# Altium footprint library 5ko.PcbLib: 126 footprints (part 7 of 8)
Each footprint in its own frame and in the unit in brackets; x right, y up, seen from the top. Pads: shape width x height; smd on the part's side, far side on the other; paste and mask are expansions set on the pad; w line width, h text height; cw(c..) or ccw(c..) is an arc to the next point about the centre after c.
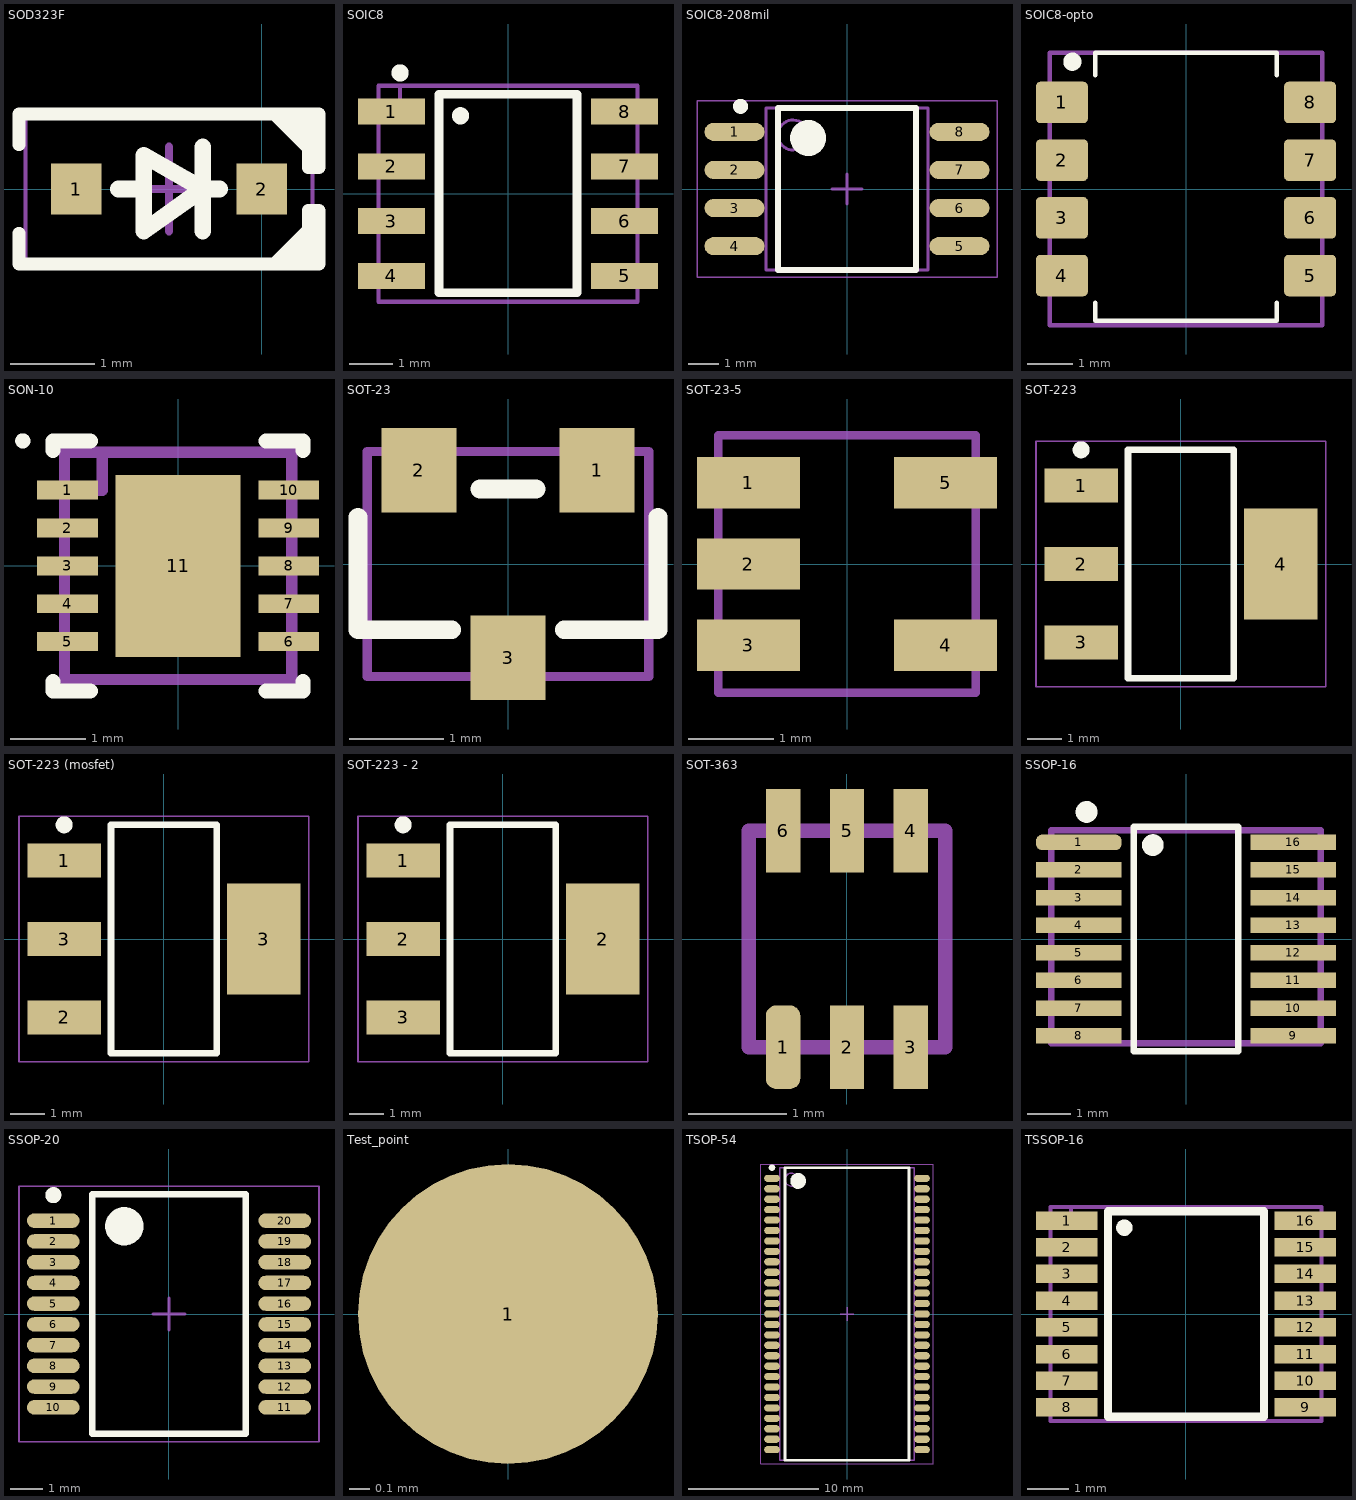
[diagram p6: the footprints below, top view; thin cyan lines are the x and y axes]

## SOD323F [mm] "SODFL, 2-Leads, Body 1.25x2.50mm, IPC Medium Density"
height 0.8
pads (2):
  rect 0.6x0.6 smd: 1(-2.2,0) 2(0,0)
Top Overlay:
  region: 0.678,0.254 0.1,0.832 0.1,0.9 0.667,0.9 0.678,0.889
  region: 0.678,-0.254 0.1,-0.832 0.1,-0.9 0.667,-0.9 0.678,-0.889
  lines w0.15: -2.878,-0.525 -2.878,-0.889 0.678,-0.889 0.678,-0.254 0.551,-0.254 0.551,-0.889 ; -2.878,0.525 -2.878,0.889 0.678,0.889 0.678,0.254 0.551,0.254 0.551,0.889
  lines w0.2: -1.7,0 -1.4,0 ; -0.7,-0.5 -0.7,0.5 ; -0.5,0 -0.7,0 ; -0.7,0 -1.4,-0.5 -1.4,0.4 -0.7,0
Mechanical 15:
  lines w0.05: -2.8,-0.85 0.6,-0.85 0.6,0.85 -2.8,0.85 -2.8,-0.85
  lines w0.1: -1.6,0 -0.6,0 ; -1.1,-0.5 -1.1,0.5
3D body "SOD323F.STEP": height 0.8, standoff 0, extent -2.35,-0.625 0.15,0.625

## SOIC8 [mm]
pads (8):
  rect 1.55x0.6 smd: 1(-2.7,1.905) 2(-2.7,0.635) 3(-2.7,-0.635) 4(-2.7,-1.905) 5(2.7,-1.905) 6(2.7,-0.635) 7(2.7,0.635) 8(2.7,1.905)
Top Layer:
  region: -2.7,1.905
Top Overlay:
  circle w0.2: c-1.1,1.805 r0.1
  circle w0.2: c-2.5,2.8 r0.1
  lines w0.2: -1.6,-2.295 1.6,-2.295 1.6,2.305 -1.6,2.305 -1.6,-2.295
Mechanical 15:
  lines w0.1: -3,2 -2.5,2 -2.5,2.5 ; -3,-2.5 3,-2.5 3,2.5 -3,2.5 -3,-2.5
  text ".Designator" at -2.1,-0.195 h0.5
3D body "SOIC-8-1.step": height 1.75, standoff 0, extent -3,-2.45 3,2.45

## SOIC8-208mil [mm] "SOIC, 8-Leads, Body 5.28x5.28mm, Pitch 1.27mm, IPC Medium Density"
height 2.16
pads (8):
  oval 2x0.6 smd: 1(-3.75,1.905) 2(-3.75,0.635) 3(-3.75,-0.635) 4(-3.75,-1.905) 5(3.75,-1.905) 6(3.75,-0.635) 7(3.75,0.635) 8(3.75,1.905)
Top Overlay:
  circle w0.6: c-1.3,1.7 r0.3
  circle w0.25: c-3.55,2.755 r0.125
  lines w0.2: -2.3,-2.7 2.3,-2.7 2.3,2.7 -2.3,2.7 -2.3,-2.7
Mechanical 13:
  circle w0.1: c-1.8,1.8 r0.5
  lines w0.1: -2.7,-2.7 2.7,-2.7 2.7,2.7 -2.7,2.7 -2.7,-2.7
Mechanical 15:
  lines w0.05: -5,-2.95 5,-2.95 5,2.95 -5,2.95 -5,-2.95
  lines w0.1: -0.5,0 0.5,0 ; 0,-0.5 0,0.5
3D body "User Library-SOIC-8-208.STEP": height 2.2, standoff 0.05, extent -4.1,-2.7 4.1,2.7

## SOIC8-opto [mm]
pads (8):
  rrect20% 1.14x0.91 smd: 1(-2.73,1.905) 2(-2.73,0.635) 3(-2.73,-0.635) 4(-2.73,-1.905) 5(2.73,-1.905) 6(2.73,-0.635) 7(2.73,0.635) 8(2.73,1.905)
Top Overlay:
  circle w0.2: c-2.5,2.8 r0.1
  lines w0.1: -2,-2.5 -2,-2.9 2,-2.9 2,-2.5 ; -2,2.5 -2,3 2,3 2,2.5
Mechanical 15:
  lines w0.1: -3,-3 -3,3 3,3 3,-3 -3,-3
  text ".Designator" at -1.2,0 h0.5
3D body "User Library-SOIC127P610X343-8N.STEP": height 3.48, standoff 0, extent -3,-2.92 3,2.92

## SON-10 [mm] "SON, 10-Leads, Body 3,00x3,00mm, Pitch 0,50mm, Thermal Pad 2,40x1,65mm, IPC Medium Density"
height 0.75
pads (11):
  rect 0.8x0.25 smd: 1(-1.46,1) 2(-1.46,0.5) 3(-1.46,0) 4(-1.46,-0.5) 5(-1.46,-1) 6(1.46,-1) 7(1.46,-0.5) 8(1.46,0) 9(1.46,0.5) 10(1.46,1)
  rect 1.65x2.4 smd: 11(0,0)
Top Overlay:
  circle w0.1: c-2.05,1.65 r0.05
  lines w0.2: -1.65,-1.525 -1.65,-1.65 -1.16,-1.65 ; -1.65,1.525 -1.65,1.65 -1.16,1.65 ; 1.16,-1.65 1.65,-1.65 1.65,-1.525 ; 1.16,1.65 1.65,1.65 1.65,1.525
Mechanical 15:
  lines w0.15: -1.5,1 -1,1 -1,1.5 ; -1.5,-1.5 1.5,-1.5 1.5,1.5 -1.5,1.5 -1.5,-1.5
  text ".Designator" at -1.2,-0.1 h0.3
3D body "SON10-3x3mm.step": height 0.87, standoff -0.03, extent -1.5,-1.5 1.5,1.5

## SOT-23 [mm]
pads (3):
  rect 0.8x0.9 smd: 1(0.95,1) 2(-0.95,1) 3(0,-1)
Top Overlay:
  lines w0.2: -1.6,0.5 -1.6,-0.7 -0.6,-0.7 ; -0.3,0.8 0.3,0.8 ; 0.6,-0.7 1.6,-0.7 1.6,0.5
Mechanical 15:
  lines w0.1: -1.5,-1.2 1.5,-1.2 1.5,1.2 -1.5,1.2 -1.5,-1.2
  text ".Designator" at -1.75,-0.1 h0.5
3D body "SOT-23.stp": height 0.98, standoff 0, extent -1.46,-1.2 1.46,1.2

## SOT-23-5 [mm]
pads (5):
  rect 1.2x0.6 smd: 1(-1.15,0.95) 2(-1.15,0) 3(-1.15,-0.95) 4(1.15,-0.95) 5(1.15,0.95)
Mechanical 15:
  lines w0.1: -1.5,-1.5 1.5,-1.5 1.5,1.5 -1.5,1.5 -1.5,-1.5
  text ".Designator" at -1.7,-0.1 h0.5
3D body "User Library-SOT23-5-1.step": height 1.3, standoff 0, extent -1.5,-1.5 1.5,1.5

## SOT-223 [mm]
height 1.8
pads (4):
  rect 2.15x1 smd: 1(-2.925,2.3) 2(-2.925,0) 3(-2.925,-2.3)
  rect 2.15x3.25 smd: 4(2.925,0)
Top Overlay:
  circle w0.25: c-2.925,3.35 r0.125
  lines w0.2: -1.55,-3.35 -1.55,3.35 1.55,3.35 1.55,-3.35 -1.55,-3.35
Mechanical 15:
  lines w0.05: -4.25,-3.6 -4.25,3.6 4.25,3.6 4.25,-3.6 -4.25,-3.6
  text ".Designator" at -1.65,-0.2 h0.5
3D body "ALSRobot-SOT-223.step": height 1.64, standoff -0.01, extent -3.5,-3.25 3.5,3.25

## SOT-223 (mosfet) [mm]
height 1.8
pads (4):
  rect 2.15x1 smd: 1(-2.925,2.3) 2(-2.925,-2.3) 3(-2.925,0)
  rect 2.15x3.25 smd: 3(2.925,0)
Top Overlay:
  circle w0.25: c-2.925,3.35 r0.125
  lines w0.2: -1.55,-3.35 -1.55,3.35 1.55,3.35 1.55,-3.35 -1.55,-3.35
Mechanical 15:
  lines w0.05: -4.25,-3.6 -4.25,3.6 4.25,3.6 4.25,-3.6 -4.25,-3.6
  text ".Designator" at -1.65,-0.2 h0.5
3D body "ALSRobot-SOT-223.step": height 1.64, standoff -0.01, extent -3.5,-3.25 3.5,3.25

## SOT-223 - 2 [mm]
height 1.8
pads (4):
  rect 2.15x1 smd: 1(-2.925,2.3) 2(-2.925,0) 3(-2.925,-2.3)
  rect 2.15x3.25 smd: 2(2.925,0)
Top Overlay:
  circle w0.25: c-2.925,3.35 r0.125
  lines w0.2: -1.55,-3.35 -1.55,3.35 1.55,3.35 1.55,-3.35 -1.55,-3.35
Mechanical 15:
  lines w0.05: -4.25,-3.6 -4.25,3.6 4.25,3.6 4.25,-3.6 -4.25,-3.6
  text ".Designator" at -1.65,-0.2 h0.5
3D body "ALSRobot-SOT-223.step": height 1.64, standoff -0.01, extent -3.5,-3.25 3.5,3.25

## SOT-363 [mm]
pads (6):
  rrect60% 0.35x0.85 smd mask+0.07: 1(-0.65,-1.1)
  rect 0.35x0.85 smd mask+0.07: 2(0,-1.1) 3(0.65,-1.1) 4(0.65,1.1) 5(0,1.1) 6(-0.65,1.1)
Mechanical 15:
  lines w0.15: -1,-1.1 1,-1.1 1,1.1 -1,1.1 -1,-1.1
  text ".Designator" at 0.1,-0.8 h0.3
3D body "SOT-363.stp": height 1, standoff 0, extent -1,-1.1 1,1.1

## SSOP-16 [mil]
pads (16):
  rrect80% 77.56x13.97 smd paste+0 mask+0: 1(-97,87.5)
  rect 77.56x13.97 smd paste+0 mask+0: 2(-97,62.5) 3(-97,37.5) 4(-97,12.5) 5(-97,-12.5) 6(-97,-37.5) 7(-97,-62.5) 8(-97,-87.5) 9(97,-87.5) 10(97,-62.5) 11(97,-37.5) 12(97,-12.5) 13(97,12.5) 14(97,37.5) 15(97,62.5) 16(97,87.5)
Top Overlay:
  circle w9.84: c-30,85 r4.92
  circle w9.84: c-90,115 r4.92
  lines w5.91: -47.16,-101.5 -47.16,101.5 ; 47.16,-101.5 47.16,101.5
  lines w6: -47.16,-101.5 47.16,-101.5 ; -47.16,101.5 47.16,101.5
Mechanical 15:
  lines w5.91: -122.05,-94.49 -122.05,98.43 122.05,98.43 122.05,-94.49 -122.05,-94.49
  text ".Designator" at -35.43,-3.94 h11.81
3D body "SSOP-16_FTD.step": height 69.09, standoff 0, extent -122,-95.51 122.01,97.48

## SSOP-20 [mm] "7.2 х 5.3"
height 2
pads (20):
  oval 1.65x0.45 smd: 1(-3.625,2.925) 2(-3.625,2.275) 3(-3.625,1.625) 4(-3.625,0.975) 5(-3.625,0.325) 6(-3.625,-0.325) 7(-3.625,-0.975) 8(-3.625,-1.625) 9(-3.625,-2.275) 10(-3.625,-2.925) 11(3.625,-2.925) 12(3.625,-2.275) 13(3.625,-1.625) 14(3.625,-0.975) 15(3.625,-0.325) 16(3.625,0.325) 17(3.625,0.975) 18(3.625,1.625) 19(3.625,2.275) 20(3.625,2.925)
Top Overlay:
  circle w0.6: c-1.4,2.75 r0.3
  circle w0.25: c-3.625,3.725 r0.125
  lines w0.2: -2.4,-3.75 2.4,-3.75 2.4,3.75 -2.4,3.75 -2.4,-3.75
Mechanical 15:
  lines w0.05: -4.7,-4 4.7,-4 4.7,4 -4.7,4 -4.7,-4
  lines w0.1: -0.5,0 0.5,0 ; 0,-0.5 0,0.5
3D body "User Library-SSOP-20.STEP": height 1.9, standoff 0, extent -3.9,-3.6 3.9,3.6

## Test_point [mm]
pads (1):
  round 1.5 smd mask+0.07: 1(0,0)

## TSOP-54 [mm] "TSOP, 54-Leads, Body 22.22x10.16mm, Pitch 0.80mm, IPC Medium Density"
height 1.2
pads (54):
  oval 1.2x0.55 smd: 1(-5.75,10.4) 2(-5.75,9.6) 3(-5.75,8.8) 4(-5.75,8) 5(-5.75,7.2) 6(-5.75,6.4) 7(-5.75,5.6) 8(-5.75,4.8) 9(-5.75,4) 10(-5.75,3.2) 11(-5.75,2.4) 12(-5.75,1.6) 13(-5.75,0.8) 14(-5.75,0) 15(-5.75,-0.8) 16(-5.75,-1.6) 17(-5.75,-2.4) 18(-5.75,-3.2) 19(-5.75,-4) 20(-5.75,-4.8) 21(-5.75,-5.6) 22(-5.75,-6.4) 23(-5.75,-7.2) 24(-5.75,-8) 25(-5.75,-8.8) 26(-5.75,-9.6) 27(-5.75,-10.4) 28(5.75,-10.4) 29(5.75,-9.6) 30(5.75,-8.8) 31(5.75,-8) 32(5.75,-7.2) 33(5.75,-6.4) 34(5.75,-5.6) 35(5.75,-4.8) 36(5.75,-4) 37(5.75,-3.2) 38(5.75,-2.4) 39(5.75,-1.6) 40(5.75,-0.8) 41(5.75,0) 42(5.75,0.8) 43(5.75,1.6) 44(5.75,2.4) 45(5.75,3.2) 46(5.75,4) 47(5.75,4.8) 48(5.75,5.6) 49(5.75,6.4) 50(5.75,7.2) 51(5.75,8) 52(5.75,8.8) 53(5.75,9.6) 54(5.75,10.4)
Top Overlay:
  circle w0.6: c-3.75,10.2 r0.3
  circle w0.25: c-5.75,11.225 r0.125
  lines w0.2: -4.75,-11.2 4.75,-11.2 4.75,11.2 -4.75,11.2 -4.75,-11.2
Mechanical 13:
  circle w0.1: c-4.25,10.3 r0.5
  lines w0.1: -5.15,-11.2 5.15,-11.2 5.15,11.2 -5.15,11.2 -5.15,-11.2
Mechanical 15:
  lines w0.05: -6.6,-11.5 6.6,-11.5 6.6,11.5 -6.6,11.5 -6.6,-11.5
  lines w0.1: -0.5,0 0.5,0 ; 0,-0.5 0,0.5
3D body "User Library-TSOPII-54.step": height 1.25, standoff 0, extent -5.88,-11.11 5.88,11.11

## TSSOP-16 [mm]
pads (16):
  rect 1.5x0.45 smd: 1(-2.9,2.275) 2(-2.9,1.625) 3(-2.9,0.975) 4(-2.9,0.325) 5(-2.9,-0.325) 6(-2.9,-0.975) 7(-2.9,-1.625) 8(-2.9,-2.275) 9(2.9,-2.275) 10(2.9,-1.625) 11(2.9,-0.975) 12(2.9,-0.325) 13(2.9,0.325) 14(2.9,0.975) 15(2.9,1.625) 16(2.9,2.275)
Top Overlay:
  circle w0.2: c-1.5,2.1 r0.1
  lines w0.2: -1.9,-2.5 1.9,-2.5 1.9,2.5 -1.9,2.5 -1.9,-2.5
Mechanical 15:
  lines w0.1: -3.3,2.1 -2.8,2.1 -2.8,2.6 ; -3.3,-2.6 -3.3,2.6 3.3,2.6 3.3,-2.6 -3.3,-2.6
  text ".Designator" at -1.8,-0.125 h0.5
3D body "TSSOP-16.step": height 1.06, standoff -0.01, extent -3.25,-2.55 3.25,2.55